# Altium footprint library Conectors.PcbLib: 123 footprints (part 4 of 8)
Each footprint in its own frame and in the unit in brackets; x right, y up, seen from the top. Pads: shape width x height; smd on the part's side, far side on the other; paste and mask are expansions set on the pad; w line width, h text height; cw(c..) or ccw(c..) is an arc to the next point about the centre after c.
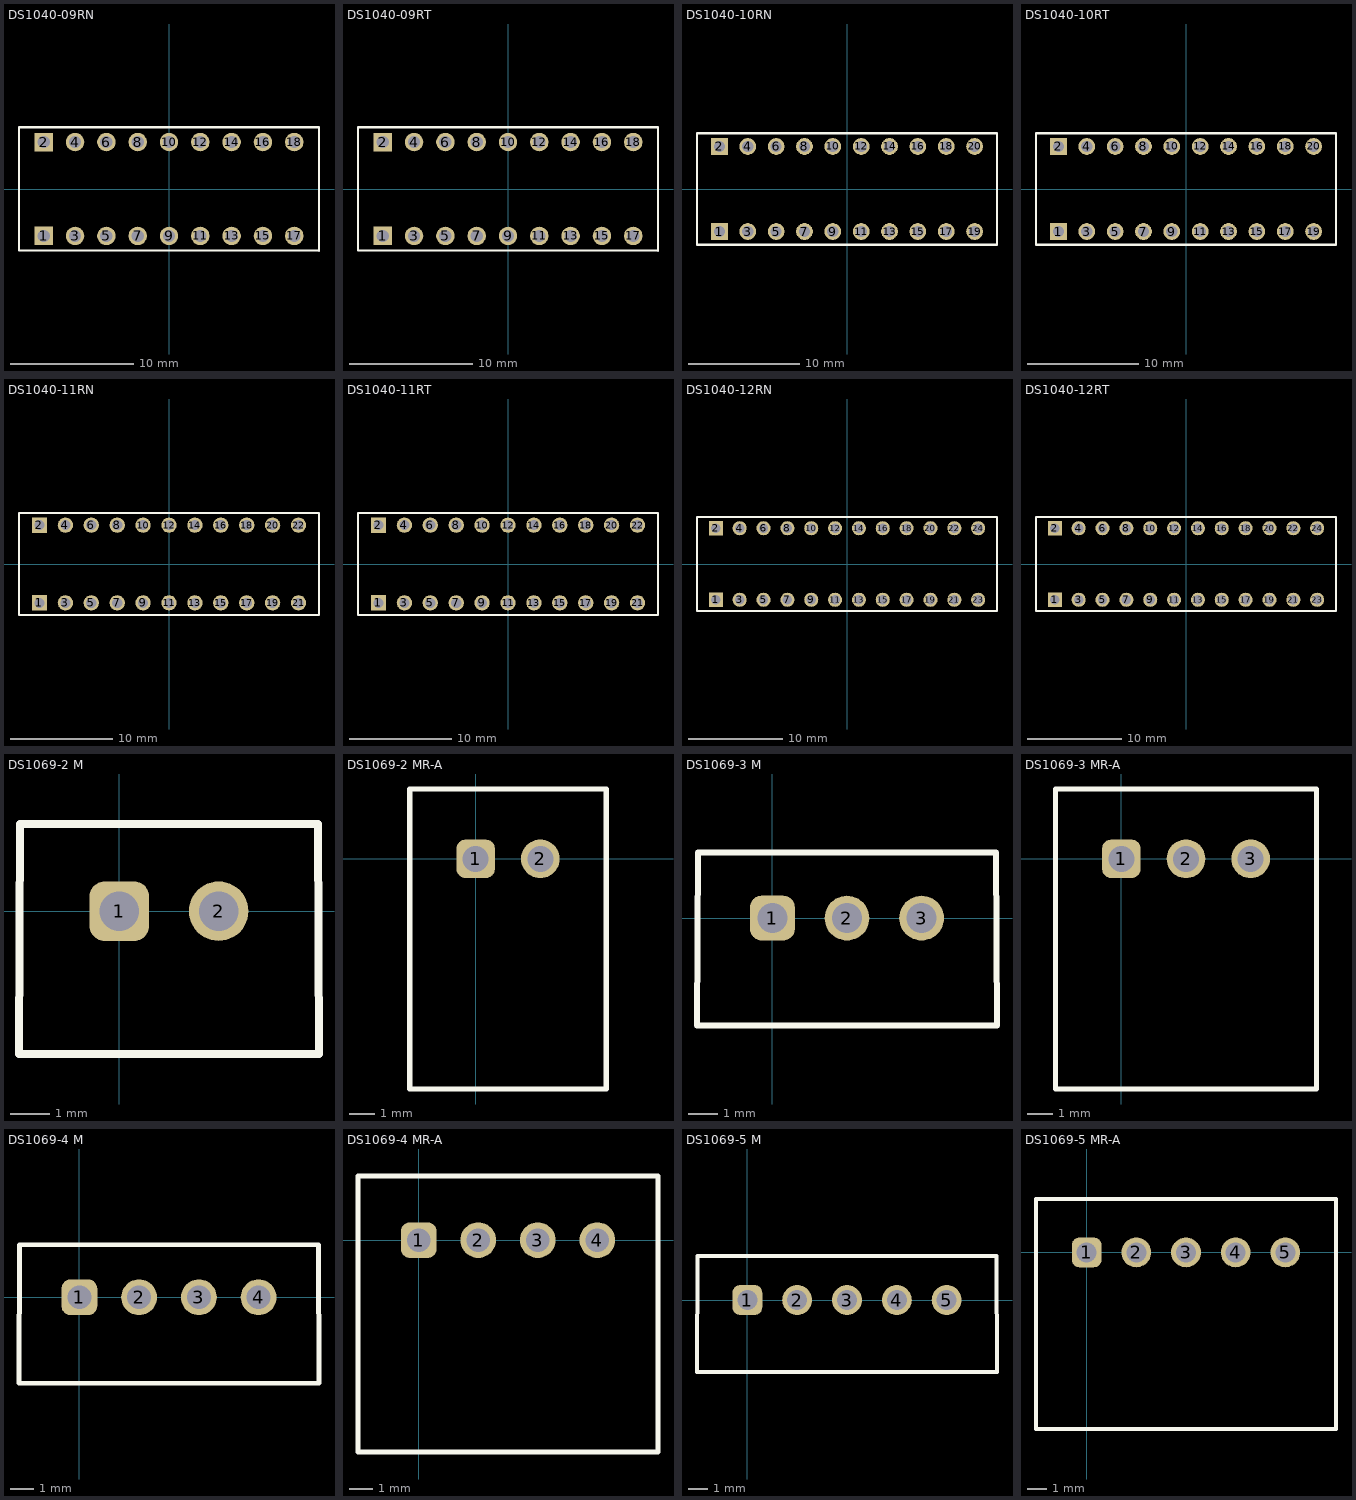
[diagram p3: the footprints below, top view; thin cyan lines are the x and y axes]

## DS1040-09RN [mm]
pads (18):
  rect 1.5x1.5 hole 1: 1(-10.16,-3.81) 2(-10.16,3.81)
  round 1.5 hole 1: 3(-7.62,-3.81) 4(-7.62,3.81) 5(-5.08,-3.81) 6(-5.08,3.81) 7(-2.54,-3.81) 8(-2.54,3.81) 9(0,-3.81) 10(0,3.81) 11(2.54,-3.81) 12(2.54,3.81) 13(5.08,-3.81) 14(5.08,3.81) 15(7.62,-3.81) 16(7.62,3.81) 17(10.16,-3.81) 18(10.16,3.81)
Top Overlay:
  lines w0.2: 12.17,-5 12.17,4.99 ; 12.17,-4.99 -12.17,-4.99 -12.17,5 12.17,5
3D body "DS1040-09 (DIP_switch).stp": height 6.8, standoff -3.85, extent -12.16,-4.95 12.16,4.95

## DS1040-09RT [mm]
pads (18):
  rect 1.5x1.5 hole 1: 1(-10.16,-3.81) 2(-10.16,3.81)
  round 1.5 hole 1: 3(-7.62,-3.81) 4(-7.62,3.81) 5(-5.08,-3.81) 6(-5.08,3.81) 7(-2.54,-3.81) 8(-2.54,3.81) 9(0,-3.81) 10(0,3.81) 11(2.54,-3.81) 12(2.54,3.81) 13(5.08,-3.81) 14(5.08,3.81) 15(7.62,-3.81) 16(7.62,3.81) 17(10.16,-3.81) 18(10.16,3.81)
Top Overlay:
  lines w0.2: 12.17,-5 12.17,4.99 ; 12.17,-4.99 -12.17,-4.99 -12.17,5 12.17,5
3D body "DS1040-09RT.stp": height 8, standoff -3, extent -12.16,-6.75 12.16,4.95

## DS1040-10RN [mm]
pads (20):
  rect 1.5x1.5 hole 1: 1(-11.43,-3.81) 2(-11.43,3.81)
  round 1.5 hole 1: 3(-8.89,-3.81) 4(-8.89,3.81) 5(-6.35,-3.81) 6(-6.35,3.81) 7(-3.81,-3.81) 8(-3.81,3.81) 9(-1.27,-3.81) 10(-1.27,3.81) 11(1.27,-3.81) 12(1.27,3.81) 13(3.81,-3.81) 14(3.81,3.81) 15(6.35,-3.81) 16(6.35,3.81) 17(8.89,-3.81) 18(8.89,3.81) 19(11.43,-3.81) 20(11.43,3.81)
Top Overlay:
  lines w0.2: 13.44,-5 13.44,4.99 ; 13.44,-4.99 -13.44,-4.99 -13.44,5 13.44,5
3D body "DS1040-10 (DIP_switch).stp": height 6.8, standoff -3.85, extent -13.43,-4.95 13.43,4.95

## DS1040-10RT [mm]
pads (20):
  rect 1.5x1.5 hole 1: 1(-11.43,-3.81) 2(-11.43,3.81)
  round 1.5 hole 1: 3(-8.89,-3.81) 4(-8.89,3.81) 5(-6.35,-3.81) 6(-6.35,3.81) 7(-3.81,-3.81) 8(-3.81,3.81) 9(-1.27,-3.81) 10(-1.27,3.81) 11(1.27,-3.81) 12(1.27,3.81) 13(3.81,-3.81) 14(3.81,3.81) 15(6.35,-3.81) 16(6.35,3.81) 17(8.89,-3.81) 18(8.89,3.81) 19(11.43,-3.81) 20(11.43,3.81)
Top Overlay:
  lines w0.2: 13.44,-5 13.44,4.99 ; 13.44,-4.99 -13.44,-4.99 -13.44,5 13.44,5
3D body "DS1040-10RT.stp": height 8, standoff -3, extent -13.43,-6.75 13.43,4.95

## DS1040-11RN [mm]
pads (22):
  rect 1.5x1.5 hole 1: 1(-12.7,-3.81) 2(-12.7,3.81)
  round 1.5 hole 1: 3(-10.16,-3.81) 4(-10.16,3.81) 5(-7.62,-3.81) 6(-7.62,3.81) 7(-5.08,-3.81) 8(-5.08,3.81) 9(-2.54,-3.81) 10(-2.54,3.81) 11(0,-3.81) 12(0,3.81) 13(2.54,-3.81) 14(2.54,3.81) 15(5.08,-3.81) 16(5.08,3.81) 17(7.62,-3.81) 18(7.62,3.81) 19(10.16,-3.81) 20(10.16,3.81) 21(12.7,-3.81) 22(12.7,3.81)
Top Overlay:
  lines w0.2: 14.71,-5 14.71,4.99 ; 14.71,-4.99 -14.71,-4.99 -14.71,5 14.71,5
3D body "DS1040-11 (DIP_switch).stp": height 6.8, standoff -3.85, extent -14.7,-4.95 14.7,4.95

## DS1040-11RT [mm]
pads (22):
  rect 1.5x1.5 hole 1: 1(-12.7,-3.81) 2(-12.7,3.81)
  round 1.5 hole 1: 3(-10.16,-3.81) 4(-10.16,3.81) 5(-7.62,-3.81) 6(-7.62,3.81) 7(-5.08,-3.81) 8(-5.08,3.81) 9(-2.54,-3.81) 10(-2.54,3.81) 11(0,-3.81) 12(0,3.81) 13(2.54,-3.81) 14(2.54,3.81) 15(5.08,-3.81) 16(5.08,3.81) 17(7.62,-3.81) 18(7.62,3.81) 19(10.16,-3.81) 20(10.16,3.81) 21(12.7,-3.81) 22(12.7,3.81)
Top Overlay:
  lines w0.2: 14.71,-5 14.71,4.99 ; 14.71,-4.99 -14.71,-4.99 -14.71,5 14.71,5
3D body "DS1040-11RT.stp": height 8, standoff -3, extent -14.7,-6.75 14.7,4.95

## DS1040-12RN [mm]
pads (24):
  rect 1.5x1.5 hole 1: 1(-13.97,-3.81) 2(-13.97,3.81)
  round 1.5 hole 1: 3(-11.43,-3.81) 4(-11.43,3.81) 5(-8.89,-3.81) 6(-8.89,3.81) 7(-6.35,-3.81) 8(-6.35,3.81) 9(-3.81,-3.81) 10(-3.81,3.81) 11(-1.27,-3.81) 12(-1.27,3.81) 13(1.27,-3.81) 14(1.27,3.81) 15(3.81,-3.81) 16(3.81,3.81) 17(6.35,-3.81) 18(6.35,3.81) 19(8.89,-3.81) 20(8.89,3.81) 21(11.43,-3.81) 22(11.43,3.81) 23(13.97,-3.81) 24(13.97,3.81)
Top Overlay:
  lines w0.2: 15.98,-5 15.98,4.99 ; 15.98,-4.99 -15.98,-4.99 -15.98,5 15.98,5
3D body "DS1040-12 (DIP_switch).stp": height 6.8, standoff -3.85, extent -15.97,-4.95 15.97,4.95

## DS1040-12RT [mm]
pads (24):
  rect 1.5x1.5 hole 1: 1(-13.97,-3.81) 2(-13.97,3.81)
  round 1.5 hole 1: 3(-11.43,-3.81) 4(-11.43,3.81) 5(-8.89,-3.81) 6(-8.89,3.81) 7(-6.35,-3.81) 8(-6.35,3.81) 9(-3.81,-3.81) 10(-3.81,3.81) 11(-1.27,-3.81) 12(-1.27,3.81) 13(1.27,-3.81) 14(1.27,3.81) 15(3.81,-3.81) 16(3.81,3.81) 17(6.35,-3.81) 18(6.35,3.81) 19(8.89,-3.81) 20(8.89,3.81) 21(11.43,-3.81) 22(11.43,3.81) 23(13.97,-3.81) 24(13.97,3.81)
Top Overlay:
  lines w0.2: 15.98,-5 15.98,4.99 ; 15.98,-4.99 -15.98,-4.99 -15.98,5 15.98,5
3D body "DS1040-12RT.stp": height 8, standoff -3, extent -15.97,-6.75 15.97,4.95

## DS1069-2 M [mm]
pads (2):
  rrect50% 1.5x1.5 hole 1: 1(0,0)
  round 1.5 hole 1: 2(2.5,0)
Top Overlay:
  lines w0.2: -2.526,-3.6 -2.5,2.2 5,2.2 5.026,-3.6 -2.526,-3.6
3D body "User Library-DS1069-2 CWF-2.STEP": height 7, standoff -3.5, extent -2.5,-3.55 5,2.2

## DS1069-2 MR-A [mm]
pads (2):
  rrect50% 1.5x1.5 hole 1: 1(0,0)
  round 1.5 hole 1: 2(2.5,0)
Top Overlay:
  lines w0.2: -2.55,-8.9 -2.55,2.7 5.05,2.7 5.05,-8.9 -2.55,-8.9
3D body "User Library-DS1069-2 CWF-2R.STEP": height 5.75, standoff -3.5, extent -2.5,-8.88 5,2.62

## DS1069-3 M [mm]
pads (3):
  rrect50% 1.5x1.5 hole 1: 1(0,0)
  round 1.5 hole 1: 2(2.5,0) 3(5,0)
Top Overlay:
  lines w0.2: -2.526,-3.6 -2.5,2.2 7.5,2.2 7.526,-3.6 -2.526,-3.6
3D body "User Library-CWF-3.step": height 7, standoff -3.5, extent -2.5,-3.55 7.5,2.2

## DS1069-3 MR-A [mm]
pads (3):
  rrect50% 1.5x1.5 hole 1: 1(0,0)
  round 1.5 hole 1: 2(2.5,0) 3(5,0)
Top Overlay:
  lines w0.2: -2.55,-8.9 -2.55,2.7 7.55,2.7 7.55,-8.9 -2.55,-8.9
3D body "User Library-DS1069-3 CWF-3R.step": height 5.75, standoff -3.5, extent -2.5,-8.88 7.5,2.62

## DS1069-4 M [mm]
pads (4):
  rrect50% 1.5x1.5 hole 1: 1(0,0)
  round 1.5 hole 1: 2(2.5,0) 3(5,0) 4(7.5,0)
Top Overlay:
  lines w0.2: -2.526,-3.6 10.026,-3.6 10,2.2 -2.5,2.2 -2.526,-3.6
3D body "User Library-CWF-4.step": height 7, standoff -3.5, extent -2.4,-3.55 10,2.2

## DS1069-4 MR-A [mm]
pads (4):
  rrect50% 1.5x1.5 hole 1: 1(0,0)
  round 1.5 hole 1: 2(2.5,0) 3(5,0) 4(7.5,0)
Top Overlay:
  lines w0.2: -2.55,-8.9 10.05,-8.9 10.05,2.7 -2.55,2.7 -2.55,-8.9
3D body "User Library-DS1069-4 CWF-4R.step": height 5.75, standoff -3.5, extent -2.5,-8.88 10,2.62

## DS1069-5 M [mm]
pads (5):
  rrect50% 1.5x1.5 hole 1: 1(0,0)
  round 1.5 hole 1: 2(2.5,0) 3(5,0) 4(7.5,0) 5(10,0)
Top Overlay:
  lines w0.2: 12.5,-3.6 -2.526,-3.6 -2.5,2.2 12.5,2.2 12.526,-3.6
3D body "User Library-CWF-5.step": height 7, standoff -3.5, extent -2.5,-3.55 12.5,2.2

## DS1069-5 MR-A [mm]
pads (5):
  rrect50% 1.5x1.5 hole 1: 1(0,0)
  round 1.5 hole 1: 2(2.5,0) 3(5,0) 4(7.5,0) 5(10,0)
Top Overlay:
  lines w0.2: -2.55,-8.9 -2.55,2.7 12.55,2.7 12.55,-8.9 -2.55,-8.9
3D body "User Library-DS1069-5 CWF-5R.step": height 5.75, standoff -3.5, extent -2.5,-8.88 12.5,2.62